# Altium footprint library ParsaLibrary.PcbLib: 526 footprints (part 22 of 33)
Each footprint in its own frame and in the unit in brackets; x right, y up, seen from the top. Pads: shape width x height; smd on the part's side, far side on the other; paste and mask are expansions set on the pad; w line width, h text height; cw(c..) or ccw(c..) is an arc to the next point about the centre after c.
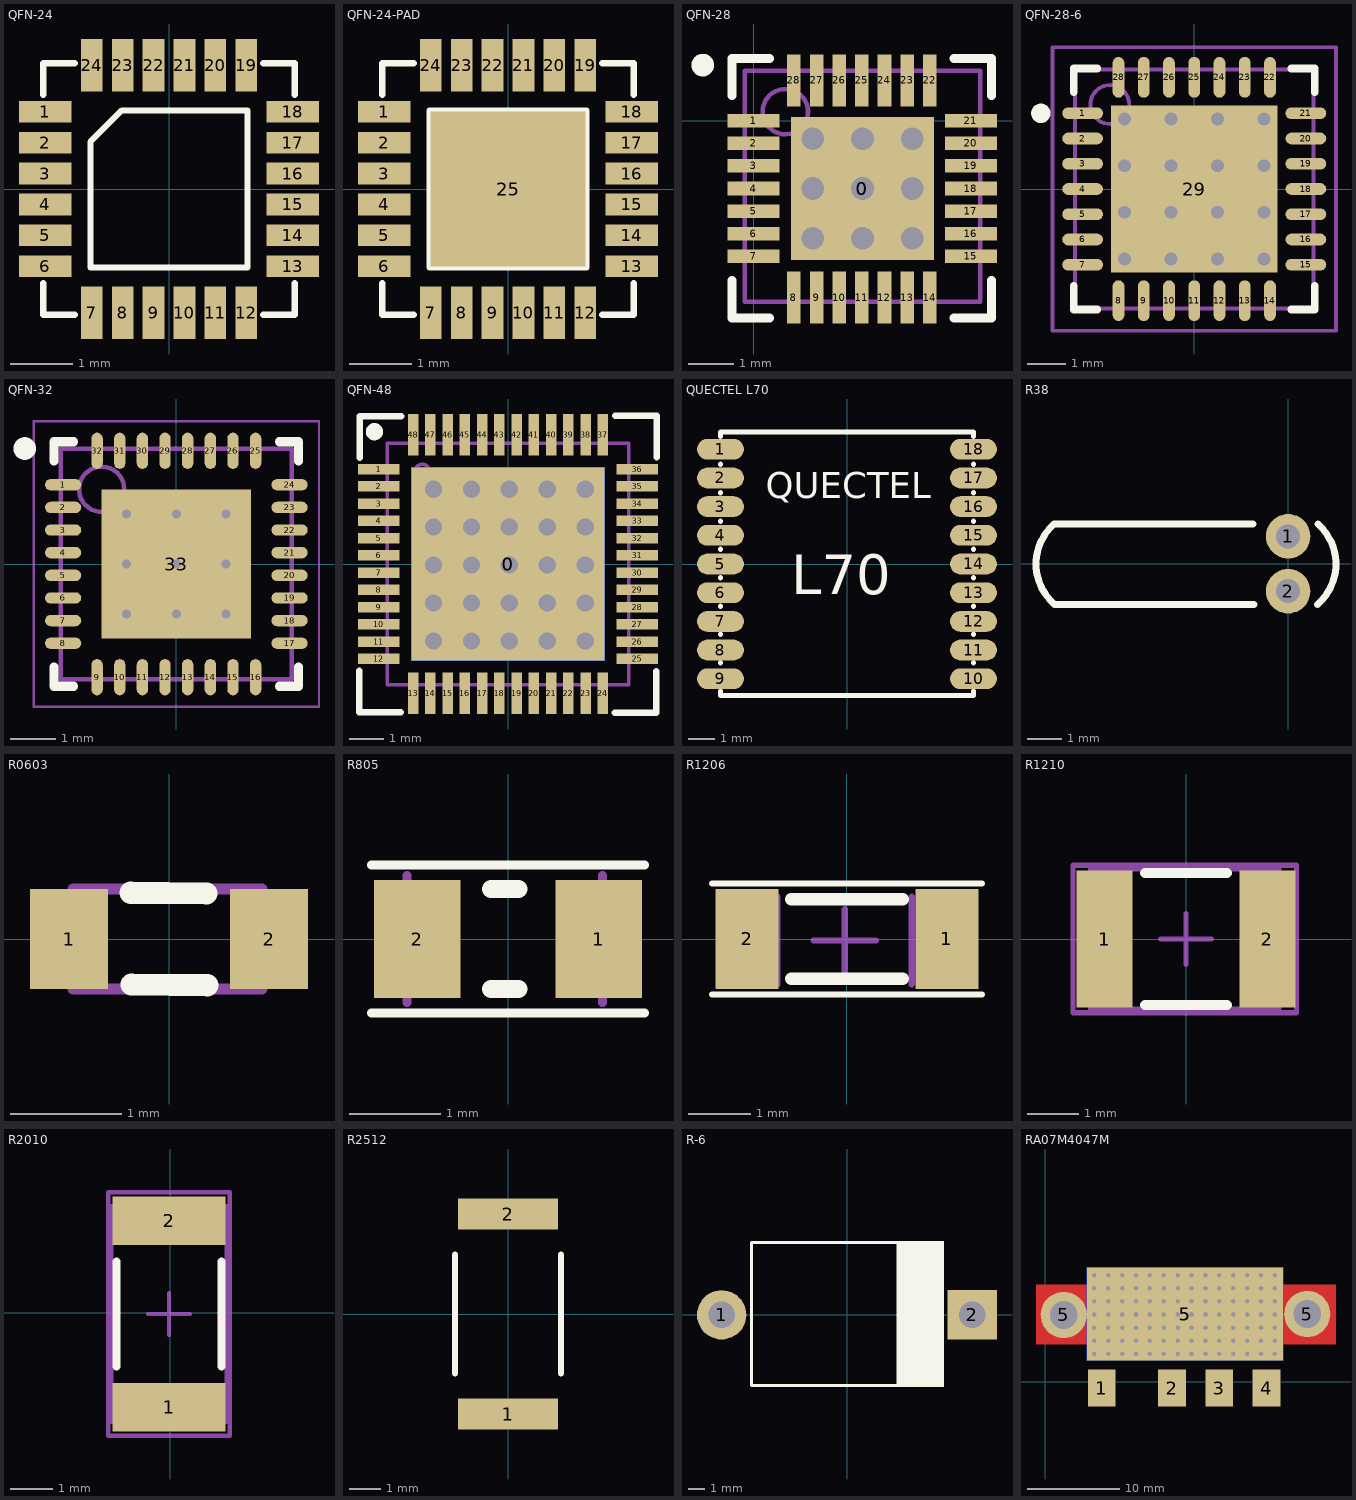
[diagram p21: the footprints below, top view; thin cyan lines are the x and y axes]

## QFN-24 [mm]
pads (24):
  rect 0.85x0.35 smd mask+0.05: 1(-2,1.25) 2(-2,0.75) 3(-2,0.25) 4(-2,-0.25) 5(-2,-0.75) 6(-2,-1.25) 13(2,-1.25) 14(2,-0.75) 15(2,-0.25) 16(2,0.25) 17(2,0.75) 18(2,1.25)
  rect 0.35x0.85 smd mask+0.05: 7(-1.25,-2) 8(-0.75,-2) 9(-0.25,-2) 10(0.25,-2) 11(0.75,-2) 12(1.25,-2) 19(1.25,2) 20(0.75,2) 21(0.25,2) 22(-0.25,2) 23(-0.75,2) 24(-1.25,2)
Top Overlay:
  lines w0.1: -2.032,-1.524 -2.032,-2.032 -1.524,-2.032 ; -2.032,1.524 -2.032,2.032 -1.524,2.032 ; 1.524,-2.032 2.032,-2.032 2.032,-1.524 ; 1.524,2.032 2.032,2.032 2.032,1.524 ; -1.27,-1.27 -1.27,0.762 -0.762,1.27 1.27,1.27 1.27,-1.27 -1.27,-1.27
3D body "QFN24(4X4).STEP": height 0.9, standoff 0, extent -2.01,-2.01 2.01,2.01

## QFN-24-PAD [mm]
pads (25):
  rect 0.85x0.35 smd mask+0.05: 1(-2,1.25) 2(-2,0.75) 3(-2,0.25) 4(-2,-0.25) 5(-2,-0.75) 6(-2,-1.25) 13(2,-1.25) 14(2,-0.75) 15(2,-0.25) 16(2,0.25) 17(2,0.75) 18(2,1.25)
  rect 0.35x0.85 smd mask+0.05: 7(-1.25,-2) 8(-0.75,-2) 9(-0.25,-2) 10(0.25,-2) 11(0.75,-2) 12(1.25,-2) 19(1.25,2) 20(0.75,2) 21(0.25,2) 22(-0.25,2) 23(-0.75,2) 24(-1.25,2)
  rect 2.5x2.5 smd mask+0.05: 25(0,0)
Top Overlay:
  lines w0.1: -2.032,-1.524 -2.032,-2.032 -1.524,-2.032 ; -2.032,1.524 -2.032,2.032 -1.524,2.032 ; 1.524,-2.032 2.032,-2.032 2.032,-1.524 ; 1.524,2.032 2.032,2.032 2.032,1.524 ; -1.27,-1.27 -1.27,1.27 1.27,1.27 1.27,-1.27 -1.27,-1.27
3D body "QFN24(4X4).STEP": height 0.9, standoff 0, extent -2.01,-2.01 2.01,2.01

## QFN-28 [mm]
pads (30):
  rect 3.15x3.15 smd: 0(2.403,-1.5)
  rect 3.15x3.15 smd far side: 0(2.403,-1.5)
  rect 1.15x0.3 smd: 1(0,0) 2(0,-0.5) 3(0,-1) 4(0,-1.5) 5(0,-2) 6(0,-2.5) 7(0,-3) 15(4.8,-3) 16(4.8,-2.5) 17(4.8,-2) 18(4.8,-1.5) 19(4.8,-1) 20(4.8,-0.5) 21(4.8,0)
  rect 0.3x1.15 smd: 8(0.889,-3.911) 9(1.389,-3.911) 10(1.889,-3.911) 11(2.389,-3.911) 12(2.889,-3.911) 13(3.389,-3.911) 14(3.889,-3.911) 22(3.889,0.889) 23(3.389,0.889) 24(2.889,0.889) 25(2.389,0.889) 26(1.889,0.889) 27(1.389,0.889) 28(0.889,0.889)
via 2.403,-0.4 diameter 0.8 hole 0.5
via 3.503,-0.4 diameter 0.8 hole 0.5
via 1.303,-1.5 diameter 0.8 hole 0.5
via 2.403,-1.5 diameter 0.8 hole 0.5
via 3.503,-1.5 diameter 0.8 hole 0.5
via 1.303,-2.6 diameter 0.8 hole 0.5
via 2.403,-2.6 diameter 0.8 hole 0.5
via 3.503,-2.6 diameter 0.8 hole 0.5
via 1.303,-0.4 diameter 0.8 hole 0.5
Top Overlay:
  circle w0.25: c-1.127,1.225 r0.125
  lines w0.2: -0.477,-3.531 -0.477,-4.356 0.348,-4.356 ; -0.477,0.55 -0.477,1.375 0.348,1.375 ; 4.429,-4.356 5.254,-4.356 5.254,-3.531 ; 4.429,1.375 5.254,1.375 5.254,0.55
Mechanical 13:
  circle w0.1: c0.7,0.198 r0.5
  lines w0.1: 5,-4 -0.2,-4 -0.2,1.098 5,1.098 5,-3.952
Mechanical 15:
  lines w0.1: 1.913,-1.524 2.913,-1.524 ; 2.413,-2.024 2.413,-1.024
3D body "QFN-28 5x5mm.stp": height 1.05, standoff 0, extent -0.097,-4 4.903,1

## QFN-28-6 [mm] "QFN, 28-Leads, Body 6x6 mm, Pitch 0.65mm, IPC Medium Density"
pads (29):
  oval 1.05x0.3 smd: 1(-2.875,1.95) 2(-2.875,1.3) 3(-2.875,0.65) 4(-2.875,0) 5(-2.875,-0.65) 6(-2.875,-1.3) 7(-2.875,-1.95) 15(2.875,-1.95) 16(2.875,-1.3) 17(2.875,-0.65) 18(2.875,0) 19(2.875,0.65) 20(2.875,1.3) 21(2.875,1.95)
  oval 0.3x1.05 smd: 8(-1.95,-2.875) 9(-1.3,-2.875) 10(-0.65,-2.875) 11(0,-2.875) 12(0.65,-2.875) 13(1.3,-2.875) 14(1.95,-2.875) 22(1.95,2.875) 23(1.3,2.875) 24(0.65,2.875) 25(0,2.875) 26(-0.65,2.875) 27(-1.3,2.875) 28(-1.95,2.875)
  rect 4.3x4.3 smd: 29(0,0)
via -1.8,1.8 diameter 0.66 hole 0.33
via -0.6,1.8 diameter 0.66 hole 0.33
via 0.6,1.8 diameter 0.66 hole 0.33
via 1.8,1.8 diameter 0.66 hole 0.33
via -1.8,0.6 diameter 0.66 hole 0.33
via -0.6,0.6 diameter 0.66 hole 0.33
via 0.6,0.6 diameter 0.66 hole 0.33
via 1.8,0.6 diameter 0.66 hole 0.33
via -1.8,-0.6 diameter 0.66 hole 0.33
via -0.6,-0.6 diameter 0.66 hole 0.33
via 0.6,-0.6 diameter 0.66 hole 0.33
via 1.8,-0.6 diameter 0.66 hole 0.33
via -1.8,-1.8 diameter 0.66 hole 0.33
via -0.6,-1.8 diameter 0.66 hole 0.33
via 0.6,-1.8 diameter 0.66 hole 0.33
via 1.8,-1.8 diameter 0.66 hole 0.33
Top Overlay:
  circle w0.25: c-3.95,1.95 r0.125
  lines w0.2: -3.1,-2.5 -3.1,-3.1 -2.5,-3.1 ; -3.1,2.5 -3.1,3.1 -2.5,3.1 ; 2.5,-3.1 3.1,-3.1 3.1,-2.5 ; 2.5,3.1 3.1,3.1 3.1,2.5
Mechanical 13:
  circle w0.1: c-2.175,2.175 r0.5
  lines w0.1: -3.075,-3.075 -3.075,3.075 3.075,3.075 3.075,-3.075 -3.075,-3.075
Mechanical 15:
  lines w0.1: -0.5,0 0.5,0 ; 0,-0.5 0,0.5 ; -3.65,-3.65 -3.65,3.65 3.65,3.65 3.65,-3.65 -3.65,-3.65
3D body "SW3dPS-QFN-28.STEP": height 1.02, standoff -0.08, extent -3.048,-3 2.952,3

## QFN-32 [mm]
pads (33):
  oval 0.8x0.25 smd: 1(-2.5,1.75) 2(-2.5,1.25) 3(-2.5,0.75) 4(-2.5,0.25) 5(-2.5,-0.25) 6(-2.5,-0.75) 7(-2.5,-1.25) 8(-2.5,-1.75) 17(2.5,-1.75) 18(2.5,-1.25) 19(2.5,-0.75) 20(2.5,-0.25) 21(2.5,0.25) 22(2.5,0.75) 23(2.5,1.25) 24(2.5,1.75)
  oval 0.25x0.8 smd: 9(-1.75,-2.5) 10(-1.25,-2.5) 11(-0.75,-2.5) 12(-0.25,-2.5) 13(0.25,-2.5) 14(0.75,-2.5) 15(1.25,-2.5) 16(1.75,-2.5) 25(1.75,2.5) 26(1.25,2.5) 27(0.75,2.5) 28(0.25,2.5) 29(-0.25,2.5) 30(-0.75,2.5) 31(-1.25,2.5) 32(-1.75,2.5)
  rect 3.3x3.3 smd: 33(0,0)
via -1.1,1.1 diameter 0.5 hole 0.2
via 0,1.1 diameter 0.5 hole 0.2
via 1.1,1.1 diameter 0.5 hole 0.2
via -1.1,0 diameter 0.5 hole 0.2
via 0,0 diameter 0.5 hole 0.2
via 1.1,0 diameter 0.5 hole 0.2
via -1.1,-1.1 diameter 0.5 hole 0.2
via 0,-1.1 diameter 0.5 hole 0.2
via 1.1,-1.1 diameter 0.5 hole 0.2
Top Overlay:
  circle w0.25: c-3.35,2.55 r0.125
  lines w0.2: -2.7,-2.275 -2.7,-2.7 -2.275,-2.7 ; -2.7,2.275 -2.7,2.7 -2.275,2.7 ; 2.275,-2.7 2.7,-2.7 2.7,-2.275 ; 2.275,2.7 2.7,2.7 2.7,2.275
Mechanical 13:
  circle w0.1: c-1.65,1.65 r0.5
  lines w0.1: -2.55,-2.55 -2.55,2.55 2.55,2.55 2.55,-2.55 -2.55,-2.55
Mechanical 15:
  lines w0.05: -3.15,-3.15 -3.15,3.15 3.15,3.15 3.15,-3.15 -3.15,-3.15
  lines w0.1: -0.5,0 0.5,0 ; 0,-0.5 0,0.5
3D body "QFN-32.STEP": height 1, standoff -0.05, extent -2.51,-2.51 2.51,2.51

## QFN-48 [mm]
pads (50):
  rect 5.6x5.6 smd far side: 0(0,0)
  rect 5.6x5.6 smd: 0(0,0)
  rect 1.2x0.3 smd: 1(-3.75,2.75) 2(-3.75,2.25) 3(-3.75,1.75) 4(-3.75,1.25) 5(-3.75,0.75) 6(-3.75,0.25) 7(-3.75,-0.25) 8(-3.75,-0.75) 9(-3.75,-1.25) 10(-3.75,-1.75) 11(-3.75,-2.25) 12(-3.75,-2.75) 25(3.75,-2.75) 26(3.75,-2.25) 27(3.75,-1.75) 28(3.75,-1.25) 29(3.75,-0.75) 30(3.75,-0.25) 31(3.75,0.25) 32(3.75,0.75) 33(3.75,1.25) 34(3.75,1.75) 35(3.75,2.25) 36(3.75,2.75)
  rect 0.3x1.2 smd: 13(-2.75,-3.75) 14(-2.25,-3.75) 15(-1.75,-3.75) 16(-1.25,-3.75) 17(-0.75,-3.75) 18(-0.25,-3.75) 19(0.25,-3.75) 20(0.75,-3.75) 21(1.25,-3.75) 22(1.75,-3.75) 23(2.25,-3.75) 24(2.75,-3.75) 37(2.75,3.75) 38(2.25,3.75) 39(1.75,3.75) 40(1.25,3.75) 41(0.75,3.75) 42(0.25,3.75) 43(-0.25,3.75) 44(-0.75,3.75) 45(-1.25,3.75) 46(-1.75,3.75) 47(-2.25,3.75) 48(-2.75,3.75)
via 2.239,1.07 diameter 0.8 hole 0.5
via 2.239,2.17 diameter 0.8 hole 0.5
via 1.139,1.07 diameter 0.8 hole 0.5
via 1.139,2.17 diameter 0.8 hole 0.5
via 2.239,-0.03 diameter 0.8 hole 0.5
via 2.239,-1.13 diameter 0.8 hole 0.5
via 2.239,-2.23 diameter 0.8 hole 0.5
via 1.139,-0.03 diameter 0.8 hole 0.5
via 1.139,-1.13 diameter 0.8 hole 0.5
via 1.139,-2.23 diameter 0.8 hole 0.5
via 0.039,-2.23 diameter 0.8 hole 0.5
via -1.061,-2.23 diameter 0.8 hole 0.5
via -2.161,-2.23 diameter 0.8 hole 0.5
via 0.039,-1.13 diameter 0.8 hole 0.5
via -1.061,-1.13 diameter 0.8 hole 0.5
via -2.161,-1.13 diameter 0.8 hole 0.5
via -2.161,2.17 diameter 0.8 hole 0.5
via 0.039,-0.03 diameter 0.8 hole 0.5
via -1.061,-0.03 diameter 0.8 hole 0.5
via -2.161,-0.03 diameter 0.8 hole 0.5
via 0.039,1.07 diameter 0.8 hole 0.5
via -1.061,1.07 diameter 0.8 hole 0.5
via -2.161,1.07 diameter 0.8 hole 0.5
via 0.039,2.17 diameter 0.8 hole 0.5
via -1.061,2.17 diameter 0.8 hole 0.5
Top Overlay:
  circle w0.25: c-3.874,3.838 r0.125
  lines w0.2: -4.313,-3.1 -4.313,-4.3 -3.113,-4.3 ; -4.298,3.084 -4.298,4.284 -3.098,4.284 ; 3.1,-4.313 4.3,-4.313 4.3,-3.113 ; 3.113,4.3 4.313,4.3 4.313,3.1
Mechanical 13:
  circle w0.1: c-2.486,2.672 r0.221
  lines w0.1: -3.5,-3.5 3.5,-3.5 3.5,3.5 -3.5,3.5 -3.5,-3.5
Mechanical 15:
  lines w0.1: 0.066,-0.015 1.066,-0.015 ; 0.566,-0.515 0.566,0.485
3D body "ALSRobot-QFN48 7x7.step": height 0.78, standoff -0.02, extent -3.51,-3.51 3.51,3.51

## QUECTEL L70 [mm]
pads (18):
  oval 1.8x0.8 smd: 1(-4.85,4.4) 2(-4.85,3.3) 3(-4.85,2.2) 4(-4.85,1.1) 5(-4.85,0) 6(-4.85,-1.1) 7(-4.85,-2.2) 8(-4.85,-3.3) 9(-4.85,-4.4) 10(4.85,-4.4) 11(4.85,-3.3) 12(4.85,-2.2) 13(4.85,-1.1) 14(4.85,0) 15(4.85,1.1) 16(4.85,2.2) 17(4.85,3.3) 18(4.85,4.4)
Top Overlay:
  lines w0.2: -4.85,-4.87 -4.85,-4.879 -4.85,-5.04 4.85,-5.04 ; -4.85,-3.793 -4.85,-3.783 ; -4.85,-2.706 -4.85,-2.697 ; -4.85,-1.619 -4.85,-1.61 ; -4.85,-0.533 -4.85,-0.524 ; -4.85,0.554 -4.85,0.563 ; -4.85,1.64 -4.85,1.649 ; -4.85,2.727 -4.85,2.736 ; -4.85,3.813 -4.85,3.823 ; -4.85,4.909 -4.85,4.9 -4.85,5.06 4.85,5.06 4.85,4.9 4.85,4.909 ; 4.85,-4.87 4.85,-4.879 ; 4.85,-3.793 4.85,-3.783 ; 4.85,-2.706 4.85,-2.697 ; 4.85,-1.619 4.85,-1.61 ; 4.85,-0.533 4.85,-0.524 ; 4.85,0.554 4.85,0.563 ; 4.85,1.64 4.85,1.649 ; 4.85,2.727 4.85,2.736 ; 4.85,3.813 4.85,3.823 ; 4.85,-5.04 4.85,-4.879 ; 4.85,-5.04 4.85,-4.879
  text "L70" at -2.132,-1.163 h1.52
  text "QUECTEL" at -3.123,2.52 h1
3D body "L70.STEP": height 2.5, standoff -0.01, extent -4.911,-5.071 4.809,5.029

## R38 [mm] "RTC Crystal PCB"
pads (2):
  round 1.3 hole 0.7: 1(0,0.8) 2(0,-0.8)
Top Overlay:
  lines w0.2: -1.024,1.159 -6.828,1.159 ccw(c-5.805,-0.006) -6.811,-1.185 -1,-1.185 ; 0.852,-1.188 ccw(c-0.154,-0.008) 0.869,1.157
3D body "User Library-DT-26-1.step": height 2, standoff -2, extent -6.891,-1.011 0.249,0.989

## R0603 [mm]
pads (2):
  rect 0.7x0.9 smd: 1(-0.9,0) 2(0.9,0)
Top Overlay:
  lines w0.2: -0.345,0.416 0.338,0.41 ; -0.338,-0.41 0.345,-0.416
Mechanical 13:
  lines w0.1: -0.863,-0.45 -0.863,0.45 0.837,0.45 0.837,-0.45 -0.863,-0.45
3D body "0603.STEP": height 0.45, standoff 0, extent -0.762,-0.381 0.762,0.381

## R805 [mm]
pads (2):
  rect 0.95x1.3 smd: 1(1,0) 2(-1,0)
Top Overlay:
  lines w0.1: -1.5,-0.813 1.5,-0.813 ; -1.5,0.813 1.5,0.813
  lines w0.2: -0.188,-0.55 0.112,-0.55 ; -0.188,0.55 0.112,0.55
Mechanical 13:
  lines w0.1: -1.113,-0.7 -1.113,0.7 ; 1.037,-0.7 1.037,0.7
3D body "User Library-0805 SMD Resistor (1).SLDPRT": height 0.78, standoff 0, extent -1,-0.61 1,0.64

## R1206 [mm]
pads (2):
  rect 1x1.6 smd: 1(1.6,0) 2(-1.6,0)
Top Overlay:
  lines w0.1: -2.159,-0.889 2.159,-0.889 ; -2.159,0.889 2.159,0.889
  lines w0.2: -0.889,-0.635 0.889,-0.635 ; -0.889,0.635 0.889,0.635
Mechanical 13:
  lines w0.1: -1.113,-0.726 -1.113,0.674 ; 1.037,-0.726 1.037,0.674
Mechanical 15:
  lines w0.1: -0.538,-0.026 0.462,-0.026 ; -0.038,-0.526 -0.038,0.474
3D body "User Library-1206 SMD Resistor.step": height 1, standoff 0, extent -1.6,-0.8 1.6,0.8

## R1210 [mm]
pads (2):
  rect 1.1x2.7 smd: 1(-1.6,0) 2(1.6,0)
Top Overlay:
  lines w0.2: -0.8,-1.3 0.8,-1.3 ; -0.8,1.3 0.8,1.3
Mechanical 13:
  lines w0.1: -1.875,-1.375 1.825,-1.375 1.825,1.375 -1.875,1.375 -1.875,-1.375
Mechanical 15:
  lines w0.1: -0.5,0 0.5,0 ; 0,-0.5 0,0.5 ; -2.225,-1.45 -2.225,1.45 2.175,1.45 2.175,-1.45 -2.225,-1.45
3D body "1210.STEP": height 0.6, standoff 0, extent -1.524,-1.27 1.524,1.27

## R2010 [mm]
pads (2):
  rect 2.7x1.15 smd: 1(-0.027,-2.252) 2(-0.027,2.198)
Top Overlay:
  lines w0.2: -1.277,-1.277 -1.277,1.223 ; 1.223,-1.277 1.223,1.223
Mechanical 13:
  lines w0.1: -1.402,-2.602 -1.402,2.548 1.348,2.548 1.348,-2.602 -1.402,-2.602
Mechanical 15:
  lines w0.1: -0.527,-0.027 0.473,-0.027 ; -0.027,-0.527 -0.027,0.473 ; -1.477,-2.927 -1.477,2.873 1.423,2.873 1.423,-2.927 -1.477,-2.927
3D body "2010.STEP": height 0.6, standoff 0, extent -1.297,-2.567 1.243,2.513

## R2512 [mm]
pads (2):
  rect 3.2x1 smd: 1(0,-3.2) 2(0,3.2)
Top Overlay:
  lines w0.2: -1.7,-1.9 -1.7,1.9 ; 1.7,-1.9 1.7,1.9
3D body "User Library-res2512_body.step": height 0.62, standoff 0, extent -1.6,-3.159 1.6,3.16

## R-6 [mm]
pads (2):
  round 3 hole 1.6: 1(-7.62,0)
  rect 3x3 hole 1.6: 2(7.62,0)
Top Overlay:
  rectangle: 3,-4.4 5.9,4.5
  lines w0.2: 3,-4.3 -5.8,-4.3 -5.8,4.4 3,4.4
3D body "User Library-Diode R-6 diameter 9_1 pitch 600mils.step": height 9.56, standoff -5.15, extent -8.27,-4.66 8.27,4.46

## RA07M4047M [mm]
pads (8):
  rect 3x4 smd: 1(6.1,-0.7) 2(13.7,-0.7) 3(18.8,-0.7) 4(23.9,-0.7)
  round 5 hole 3: 5(2,7.2) 5(28.3,7.3)
  rect 21.2x10 smd: 5(15.1,7.3)
  rect 21.2x10 smd far side: 5(15.1,7.3)
via 5.3,11.5 diameter 1 hole 0.5
via 6.8,11.5 diameter 1 hole 0.5
via 5.3,10.083 diameter 1 hole 0.5
via 5.3,8.667 diameter 1 hole 0.5
via 5.3,7.25 diameter 1 hole 0.5
via 5.3,5.833 diameter 1 hole 0.5
via 5.3,4.417 diameter 1 hole 0.5
via 5.3,3 diameter 1 hole 0.5
via 6.8,3 diameter 1 hole 0.5
via 6.8,4.417 diameter 1 hole 0.5
via 6.8,5.833 diameter 1 hole 0.5
via 6.8,7.25 diameter 1 hole 0.5
via 6.8,8.667 diameter 1 hole 0.5
via 6.8,10.083 diameter 1 hole 0.5
via 8.3,10.083 diameter 1 hole 0.5
via 8.3,8.667 diameter 1 hole 0.5
via 8.3,7.25 diameter 1 hole 0.5
via 8.3,5.833 diameter 1 hole 0.5
via 8.3,4.417 diameter 1 hole 0.5
via 8.3,3 diameter 1 hole 0.5
via 8.3,11.5 diameter 1 hole 0.5
via 9.8,10.083 diameter 1 hole 0.5
via 9.8,8.667 diameter 1 hole 0.5
via 9.8,7.25 diameter 1 hole 0.5
via 9.8,5.833 diameter 1 hole 0.5
via 9.8,4.417 diameter 1 hole 0.5
via 9.8,3 diameter 1 hole 0.5
via 9.8,11.5 diameter 1 hole 0.5
via 11.3,10.083 diameter 1 hole 0.5
via 11.3,8.667 diameter 1 hole 0.5
via 11.3,7.25 diameter 1 hole 0.5
via 11.3,5.833 diameter 1 hole 0.5
via 11.3,4.417 diameter 1 hole 0.5
via 11.3,3 diameter 1 hole 0.5
via 11.3,11.5 diameter 1 hole 0.5
via 17.3,11.5 diameter 1 hole 0.5
via 17.3,3 diameter 1 hole 0.5
via 17.3,4.417 diameter 1 hole 0.5
via 17.3,5.833 diameter 1 hole 0.5
via 17.3,7.25 diameter 1 hole 0.5
via 17.3,8.667 diameter 1 hole 0.5
via 17.3,10.083 diameter 1 hole 0.5
via 15.8,11.5 diameter 1 hole 0.5
via 15.8,3 diameter 1 hole 0.5
via 15.8,4.417 diameter 1 hole 0.5
via 15.8,5.833 diameter 1 hole 0.5
via 15.8,7.25 diameter 1 hole 0.5
via 15.8,8.667 diameter 1 hole 0.5
via 15.8,10.083 diameter 1 hole 0.5
via 14.3,11.5 diameter 1 hole 0.5
via 14.3,3 diameter 1 hole 0.5
via 14.3,4.417 diameter 1 hole 0.5
via 14.3,5.833 diameter 1 hole 0.5
via 14.3,7.25 diameter 1 hole 0.5
via 14.3,8.667 diameter 1 hole 0.5
via 14.3,10.083 diameter 1 hole 0.5
via 12.8,10.083 diameter 1 hole 0.5
via 12.8,8.667 diameter 1 hole 0.5
via 12.8,7.25 diameter 1 hole 0.5
via 12.8,5.833 diameter 1 hole 0.5
via 12.8,4.417 diameter 1 hole 0.5
via 12.8,3 diameter 1 hole 0.5
via 12.8,11.5 diameter 1 hole 0.5
via 23.3,11.5 diameter 1 hole 0.5
via 23.3,3 diameter 1 hole 0.5
via 23.3,4.417 diameter 1 hole 0.5
via 23.3,5.833 diameter 1 hole 0.5
via 23.3,7.25 diameter 1 hole 0.5
via 23.3,8.667 diameter 1 hole 0.5
via 23.3,10.083 diameter 1 hole 0.5
via 21.8,11.5 diameter 1 hole 0.5
via 21.8,3 diameter 1 hole 0.5
via 21.8,4.417 diameter 1 hole 0.5
via 21.8,5.833 diameter 1 hole 0.5
via 21.8,7.25 diameter 1 hole 0.5
via 21.8,8.667 diameter 1 hole 0.5
via 21.8,10.083 diameter 1 hole 0.5
via 20.3,11.5 diameter 1 hole 0.5
via 20.3,3 diameter 1 hole 0.5
via 20.3,4.417 diameter 1 hole 0.5
via 20.3,5.833 diameter 1 hole 0.5
via 20.3,7.25 diameter 1 hole 0.5
via 20.3,8.667 diameter 1 hole 0.5
via 20.3,10.083 diameter 1 hole 0.5
via 18.8,10.083 diameter 1 hole 0.5
via 18.8,8.667 diameter 1 hole 0.5
via 18.8,7.25 diameter 1 hole 0.5
via 18.8,5.833 diameter 1 hole 0.5
via 18.8,4.417 diameter 1 hole 0.5
via 18.8,3 diameter 1 hole 0.5
via 18.8,11.5 diameter 1 hole 0.5
via 24.8,10.084 diameter 1 hole 0.5
via 24.8,8.667 diameter 1 hole 0.5
via 24.8,7.25 diameter 1 hole 0.5
via 24.8,5.834 diameter 1 hole 0.5
via 24.8,4.417 diameter 1 hole 0.5
via 24.8,3 diameter 1 hole 0.5
via 24.8,11.5 diameter 1 hole 0.5
Top Layer:
  rectangle: 25.7,4 31.4,10.5
  rectangle: -1,4 4.5,10.5
3D body "User Library-RA07H4047M.step": height 5.4, standoff 0, extent 0,-0.479 30,12.279